# Altium footprint library connectors.PCBLIB: 188 footprints (part 8 of 12)
Each footprint in its own frame and in the unit in brackets; x right, y up, seen from the top. Pads: shape width x height; smd on the part's side, far side on the other; paste and mask are expansions set on the pad; w line width, h text height; cw(c..) or ccw(c..) is an arc to the next point about the centre after c.
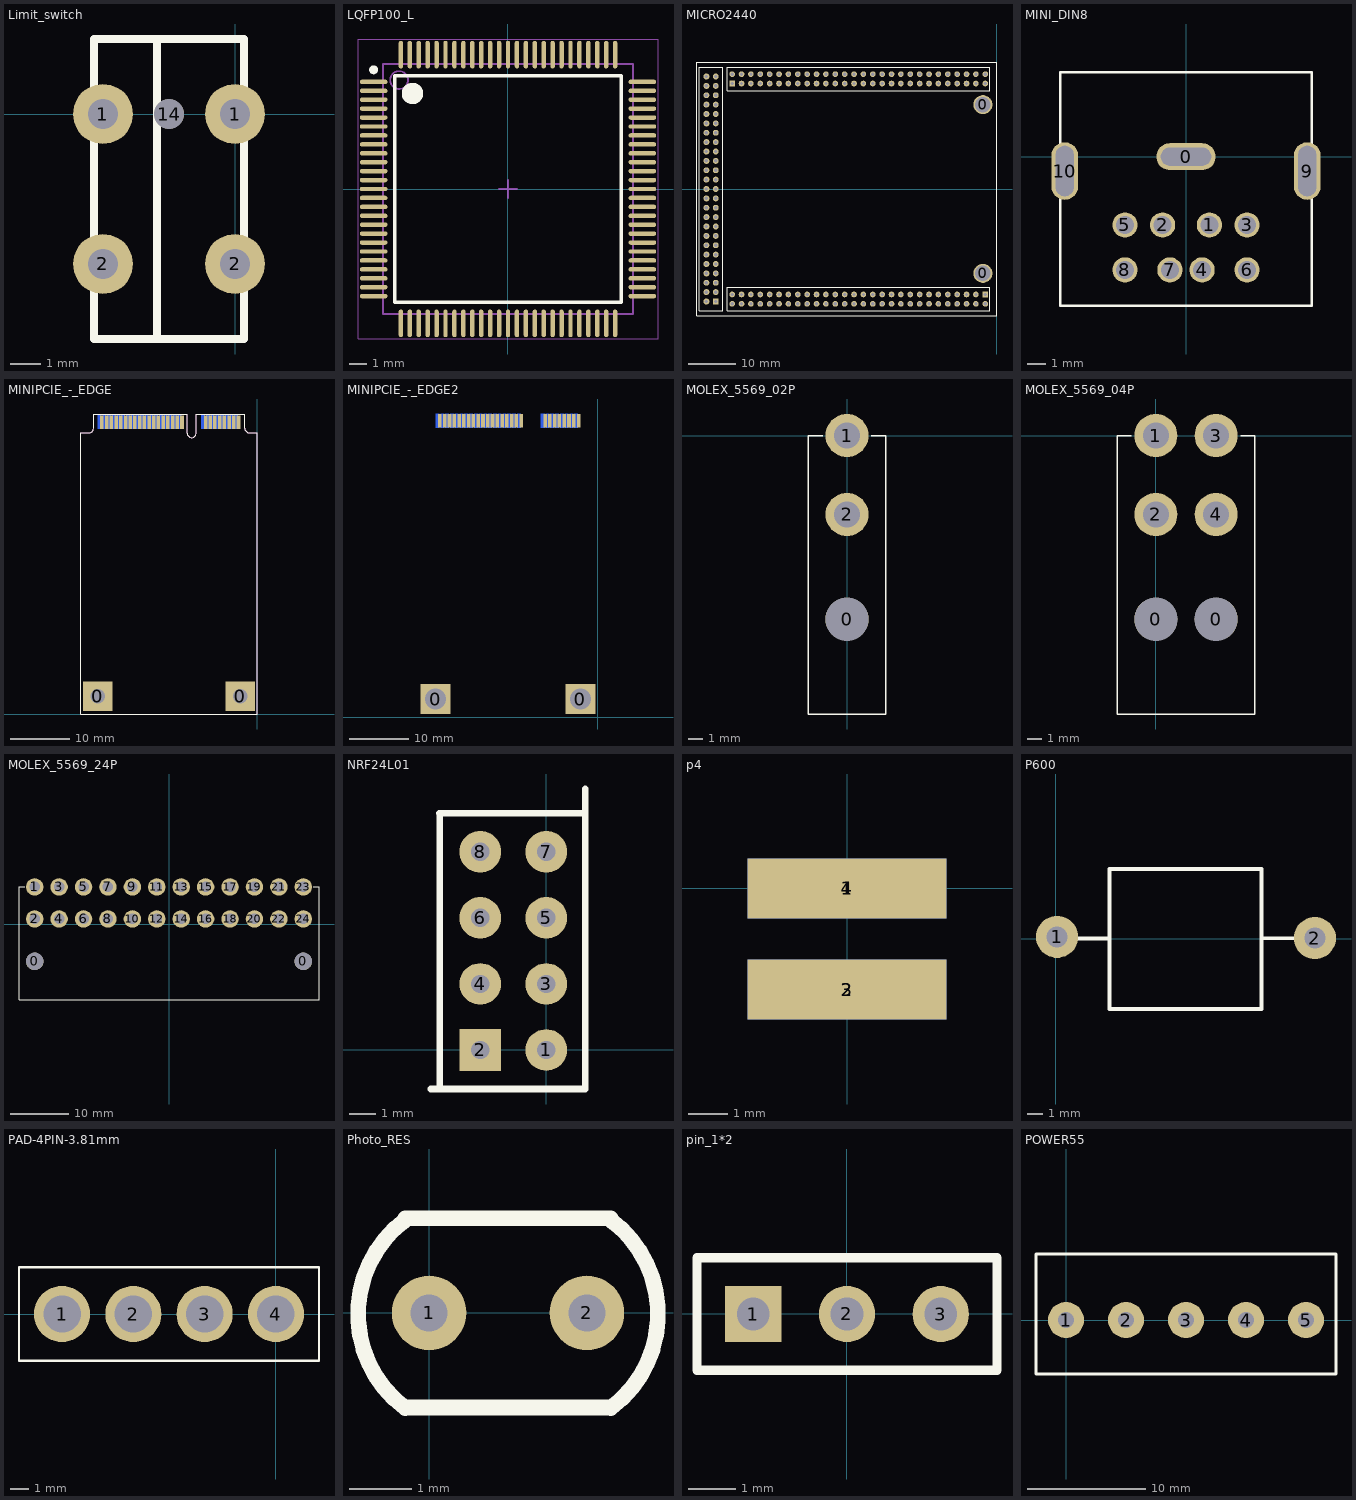
[diagram p7: the footprints below, top view; thin cyan lines are the x and y axes]

## Limit_switch [mm]
pads (5):
  round 2 hole 1: 1(-4.4,0) 1(0,0) 2(-4.4,-5) 2(0,-5)
  round 1 hole 1: 14(-2.2,0)
Top Overlay:
  lines w0.254: -2.6,-7.5 -2.6,2.5 ; -4.7,-7.5 -4.7,2.5 0.3,2.5 0.3,-7.5 -4.7,-7.5

## LQFP100_L [mm] "Thin QFP, 100-Leads, Body 14x14mm, Pitch 0.5mm, IPC High Density"
height 1.6
pads (100):
  oval 1.55x0.25 smd: 1(-7.525,6) 2(-7.525,5.5) 3(-7.525,5) 4(-7.525,4.5) 5(-7.525,4) 6(-7.525,3.5) 7(-7.525,3) 8(-7.525,2.5) 9(-7.525,2) 10(-7.525,1.5) 11(-7.525,1) 12(-7.525,0.5) 13(-7.525,0) 14(-7.525,-0.5) 15(-7.525,-1) 16(-7.525,-1.5) 17(-7.525,-2) 18(-7.525,-2.5) 19(-7.525,-3) 20(-7.525,-3.5) 21(-7.525,-4) 22(-7.525,-4.5) 23(-7.525,-5) 24(-7.525,-5.5) 25(-7.525,-6) 51(7.525,-6) 52(7.525,-5.5) 53(7.525,-5) 54(7.525,-4.5) 55(7.525,-4) 56(7.525,-3.5) 57(7.525,-3) 58(7.525,-2.5) 59(7.525,-2) 60(7.525,-1.5) 61(7.525,-1) 62(7.525,-0.5) 63(7.525,0) 64(7.525,0.5) 65(7.525,1) 66(7.525,1.5) 67(7.525,2) 68(7.525,2.5) 69(7.525,3) 70(7.525,3.5) 71(7.525,4) 72(7.525,4.5) 73(7.525,5) 74(7.525,5.5) 75(7.525,6)
  oval 0.25x1.55 smd: 26(-6,-7.525) 27(-5.5,-7.525) 28(-5,-7.525) 29(-4.5,-7.525) 30(-4,-7.525) 31(-3.5,-7.525) 32(-3,-7.525) 33(-2.5,-7.525) 34(-2,-7.525) 35(-1.5,-7.525) 36(-1,-7.525) 37(-0.5,-7.525) 38(0,-7.525) 39(0.5,-7.525) 40(1,-7.525) 41(1.5,-7.525) 42(2,-7.525) 43(2.5,-7.525) 44(3,-7.525) 45(3.5,-7.525) 46(4,-7.525) 47(4.5,-7.525) 48(5,-7.525) 49(5.5,-7.525) 50(6,-7.525) 76(6,7.525) 77(5.5,7.525) 78(5,7.525) 79(4.5,7.525) 80(4,7.525) 81(3.5,7.525) 82(3,7.525) 83(2.5,7.525) 84(2,7.525) 85(1.5,7.525) 86(1,7.525) 87(0.5,7.525) 88(0,7.525) 89(-0.5,7.525) 90(-1,7.525) 91(-1.5,7.525) 92(-2,7.525) 93(-2.5,7.525) 94(-3,7.525) 95(-3.5,7.525) 96(-4,7.525) 97(-4.5,7.525) 98(-5,7.525) 99(-5.5,7.525) 100(-6,7.525)
Top Overlay:
  circle w0.25: c-7.525,6.675 r0.125
  circle w0.6: c-5.35,5.35 r0.3
  lines w0.2: -6.35,-6.35 -6.35,6.35 6.35,6.35 6.35,-6.35 -6.35,-6.35
Mechanical 13:
  circle w0.1: c-6.1,6.1 r0.5
  lines w0.1: -7,-7 -7,7 7,7 7,-7 -7,-7
Mechanical 15:
  lines w0.05: -8.4,-8.4 -8.4,8.4 8.4,8.4 8.4,-8.4 -8.4,-8.4
  lines w0.1: -0.5,0 0.5,0 ; 0,-0.5 0,0.5
3D body: height 1.6, standoff 0, extent -7,-7 7,7

## MICRO2440 [mm]
pads (164):
  round 4.064 hole 3.302: 0(-3,-18) 0(-3,18)
  rect 1.2x1.2 hole 0.7: PA1(-2.5,-22.5) PC1(-56.5,22.5)
  round 1.2 hole 0.7: PA2(-2.5,-24.5) PA3(-4.5,-22.5) PA4(-4.5,-24.5) PA5(-6.5,-22.5) PA6(-6.5,-24.5) PA7(-8.5,-22.5) PA8(-8.5,-24.5) PA9(-10.5,-22.5) PA10(-10.5,-24.5) PA11(-12.5,-22.5) PA12(-12.5,-24.5) PA13(-14.5,-22.5) PA14(-14.5,-24.5) PA15(-16.5,-22.5) PA16(-16.5,-24.5) PA17(-18.5,-22.5) PA18(-18.5,-24.5) PA19(-20.5,-22.5) PA20(-20.5,-24.5) PA21(-22.5,-22.5) PA22(-22.5,-24.5) PA23(-24.5,-22.5) PA24(-24.5,-24.5) PA25(-26.5,-22.5) PA26(-26.5,-24.5) PA27(-28.5,-22.5) PA28(-28.5,-24.5) PA29(-30.5,-22.5) PA30(-30.5,-24.5) PA31(-32.5,-22.5) PA32(-32.5,-24.5) PA33(-34.5,-22.5) PA34(-34.5,-24.5) PA35(-36.5,-22.5) PA36(-36.5,-24.5) PA37(-38.5,-22.5) PA38(-38.5,-24.5) PA39(-40.5,-22.5) PA40(-40.5,-24.5) PA41(-42.5,-22.5) PA42(-42.5,-24.5) PA43(-44.5,-22.5) PA44(-44.5,-24.5) PA45(-46.5,-22.5) PA46(-46.5,-24.5) PA47(-48.5,-22.5) PA48(-48.5,-24.5) PA49(-50.5,-22.5) PA50(-50.5,-24.5) PA51(-52.5,-22.5) PA52(-52.5,-24.5) PA53(-54.5,-22.5) PA54(-54.5,-24.5) PA55(-56.5,-22.5) PA56(-56.5,-24.5) PC2(-56.5,24.5) PC3(-54.5,22.5) PC4(-54.5,24.5) PC5(-52.5,22.5) PC6(-52.5,24.5) PC7(-50.5,22.5) PC8(-50.5,24.5) PC9(-48.5,22.5) PC10(-48.5,24.5) PC11(-46.5,22.5) PC12(-46.5,24.5) PC13(-44.5,22.5) PC14(-44.5,24.5) PC15(-42.5,22.5) PC16(-42.5,24.5) PC17(-40.5,22.5) PC18(-40.5,24.5) PC19(-38.5,22.5) PC20(-38.5,24.5) PC21(-36.5,22.5) PC22(-36.5,24.5) PC23(-34.5,22.5) PC24(-34.5,24.5) PC25(-32.5,22.5) PC26(-32.5,24.5) PC27(-30.5,22.5) PC28(-30.5,24.5) PC29(-28.5,22.5) PC30(-28.5,24.5) PC31(-26.5,22.5) PC32(-26.5,24.5) PC33(-24.5,22.5) PC34(-24.5,24.5) PC35(-22.5,22.5) PC36(-22.5,24.5) PC37(-20.5,22.5) PC38(-20.5,24.5) PC39(-18.5,22.5) PC40(-18.5,24.5) PC41(-16.5,22.5) PC42(-16.5,24.5) PC43(-14.5,22.5) PC44(-14.5,24.5) PC45(-12.5,22.5) PC46(-12.5,24.5) PC47(-10.5,22.5) PC48(-10.5,24.5) PC49(-8.5,22.5) PC50(-8.5,24.5) PC51(-6.5,22.5) PC52(-6.5,24.5) PC53(-4.5,22.5) PC54(-4.5,24.5) PC55(-2.5,22.5) PC56(-2.5,24.5)
  rect 1.27x1.27 hole 0.7: PB1(-60,-24)
  round 1.27 hole 0.7: PB2(-62,-24) PB3(-60,-22) PB4(-62,-22) PB5(-60,-20) PB6(-62,-20) PB7(-60,-18) PB8(-62,-18) PB9(-60,-16) PB10(-62,-16) PB11(-60,-14) PB12(-62,-14) PB13(-60,-12) PB14(-62,-12) PB15(-60,-10) PB16(-62,-10) PB17(-60,-8) PB18(-62,-8) PB19(-60,-6) PB20(-62,-6) PB21(-60,-4) PB22(-62,-4) PB23(-60,-2) PB24(-62,-2) PB25(-60,0) PB26(-62,0) PB27(-60,2) PB28(-62,2) PB29(-60,4) PB30(-62,4) PB31(-60,6) PB32(-62,6) PB33(-60,8) PB34(-62,8) PB35(-60,10) PB36(-62,10) PB37(-60,12) PB38(-62,12) PB39(-60,14) PB40(-62,14) PB41(-60,16) PB42(-62,16) PB43(-60,18) PB44(-62,18) PB45(-60,20) PB46(-62,20) PB47(-60,22) PB48(-62,22) PB49(-60,24) PB50(-62,24)
Top Overlay:
  lines w0.2: -63.49,-26.005 -63.49,25.995 -58.49,25.995 -58.49,-26.005 -63.49,-26.005
  lines w0.203: -64,-27 0,-27 0,27 -64,27 -64,-27
  lines w0.254: -57.51,-25.999 -57.51,-20.999 -1.51,-20.999 -1.51,-25.999 -57.51,-25.999 ; -57.5,21 -57.5,26 -1.5,26 -1.5,21 -57.5,21

## MINI_DIN8 [mm]
pads (11):
  oval 3.3x1.5 hole 1 slot 2.8 at 0 deg: 0(-0.019,0.013)
  round 1.4 hole 1: 1(1.281,-3.787) 2(-1.319,-3.787) 3(3.381,-3.787) 4(0.881,-6.287) 5(-3.419,-3.787) 6(3.381,-6.287) 7(-0.919,-6.287) 8(-3.419,-6.287)
  oval 1.5x3.2 hole 1 slot 2.8 at 90 deg: 9(6.731,-0.787) 10(-6.769,-0.787)
Top Overlay:
  lines w0.127: -7.019,-2.287 -7.019,-8.287 6.981,-8.287 6.981,-2.287 ; -7.019,0.664 -7.019,4.713 6.981,4.713 6.981,0.664

## MINIPCIE_-_EDGE [mm]
pads (54):
  rect 5x5 hole 2.5: 0(-27.127,3.023) 0(-2.896,3.023)
  rect 0.6x2.3 smd: 1(-3.2,49.581) 3(-4,49.581) 5(-4.8,49.581) 7(-5.6,49.581) 9(-6.4,49.581) 11(-7.2,49.581) 13(-8,49.581) 15(-8.8,49.581) 17(-12.8,49.581) 19(-13.6,49.581) 21(-14.4,49.581) 23(-15.2,49.581) 25(-16,49.581) 27(-16.8,49.581) 29(-17.6,49.581) 31(-18.4,49.581) 33(-19.2,49.581) 35(-20,49.581) 37(-20.8,49.581) 39(-21.6,49.581) 41(-22.4,49.581) 43(-23.2,49.581) 45(-24,49.581) 47(-24.8,49.581) 49(-25.6,49.581) 51(-26.4,49.581)
  rect 0.6x2.3 smd far side: 2(-3.6,49.581) 4(-4.4,49.581) 6(-5.2,49.581) 8(-6,49.581) 10(-6.8,49.581) 12(-7.6,49.581) 14(-8.4,49.581) 16(-9.2,49.581) 18(-13.2,49.581) 20(-14,49.581) 22(-14.8,49.581) 24(-15.6,49.581) 26(-16.4,49.581) 28(-17.2,49.581) 30(-18,49.581) 32(-18.8,49.581) 34(-19.6,49.581) 36(-20.4,49.581) 38(-21.2,49.581) 40(-22,49.581) 42(-22.8,49.581) 44(-23.6,49.581) 46(-24.4,49.581) 48(-25.2,49.581) 50(-26,49.581) 52(-26.8,49.581)
Top Overlay:
  lines w0.127: -30.023,0 -30.023,47.777 -28.6,47.777 ccw(c-28.6,48.539) -27.838,48.539 -27.838,50.978 -11.913,50.978 -11.913,47.752 -11.913,47.727 ccw(c-11.151,47.727) -11.151,46.965 ccw(c-11.151,47.727) -10.389,47.727 -10.389,50.978 -2.159,50.978 -2.159,48.59 ccw(c-1.346,48.59) -1.346,47.777 0,47.777 0,0 -30.023,0
Keep-Out Layer:
  lines w0.127: -30.023,0 -30.023,47.777 -28.651,47.777 -28.6,47.777 ccw(c-28.6,48.539) -27.838,48.539 -27.838,50.978 -11.913,50.978 -11.913,47.727 ccw(c-11.151,47.727) -11.151,46.965 ccw(c-11.151,47.727) -10.389,47.727 -10.389,50.978 -2.159,50.978 -2.159,48.59 ccw(c-1.346,48.59) -1.346,47.777 0,47.777 0,0 -30.023,0

## MINIPCIE_-_EDGE2 [mm]
pads (54):
  rect 5x5 hole 3.5: 0(-27.127,3.023) 0(-2.896,3.023)
  rect 0.6x2.3 smd: 1(-3.2,49.581) 3(-4,49.581) 5(-4.8,49.581) 7(-5.6,49.581) 9(-6.4,49.581) 11(-7.2,49.581) 13(-8,49.581) 15(-8.8,49.581) 17(-12.8,49.581) 19(-13.6,49.581) 21(-14.4,49.581) 23(-15.2,49.581) 25(-16,49.581) 27(-16.8,49.581) 29(-17.6,49.581) 31(-18.4,49.581) 33(-19.2,49.581) 35(-20,49.581) 37(-20.8,49.581) 39(-21.6,49.581) 41(-22.4,49.581) 43(-23.2,49.581) 45(-24,49.581) 47(-24.8,49.581) 49(-25.6,49.581) 51(-26.4,49.581)
  rect 0.6x2.3 smd far side: 2(-3.6,49.581) 4(-4.4,49.581) 6(-5.2,49.581) 8(-6,49.581) 10(-6.8,49.581) 12(-7.6,49.581) 14(-8.4,49.581) 16(-9.2,49.581) 18(-13.2,49.581) 20(-14,49.581) 22(-14.8,49.581) 24(-15.6,49.581) 26(-16.4,49.581) 28(-17.2,49.581) 30(-18,49.581) 32(-18.8,49.581) 34(-19.6,49.581) 36(-20.4,49.581) 38(-21.2,49.581) 40(-22,49.581) 42(-22.8,49.581) 44(-23.6,49.581) 46(-24.4,49.581) 48(-25.2,49.581) 50(-26,49.581) 52(-26.8,49.581)

## MOLEX_5569_02P [mm]
pads (3):
  round 3 hole 3: 0(0,-12.8)
  round 3 hole 1.8: 1(0,0) 2(0,-5.5)
Top Overlay:
  lines w0.1: -1.7,0 -2.7,0 -2.7,-19.4 2.7,-19.4 2.7,0 1.7,0

## MOLEX_5569_04P [mm]
pads (6):
  round 3 hole 3: 0(0,-12.8) 0(4.2,-12.8)
  round 3 hole 1.8: 1(0,0) 2(0,-5.5) 3(4.2,0) 4(4.2,-5.5)
Top Overlay:
  lines w0.1: -1.7,0 -2.7,0 -2.7,-19.4 6.9,-19.4 6.9,0 5.9,0

## MOLEX_5569_24P [mm]
pads (26):
  round 3 hole 3: 0(-23.1,-6.4) 0(23.1,-6.4)
  round 3 hole 1.8: 1(-23.1,6.4) 2(-23.1,0.9) 3(-18.9,6.4) 4(-18.9,0.9) 5(-14.7,6.4) 6(-14.7,0.9) 7(-10.5,6.4) 8(-10.5,0.9) 9(-6.3,6.4) 10(-6.3,0.9) 11(-2.1,6.4) 12(-2.1,0.9) 13(2.1,6.4) 14(2.1,0.9) 15(6.3,6.4) 16(6.3,0.9) 17(10.5,6.4) 18(10.5,0.9) 19(14.7,6.4) 20(14.7,0.9) 21(18.9,6.4) 22(18.9,0.9) 23(23.1,6.4) 24(23.1,0.9)
Top Overlay:
  lines w0.1: -24.8,6.4 -25.8,6.4 -25.8,-13 25.8,-13 25.8,6.4 24.8,6.4

## NRF24L01 [mm]
pads (8):
  round 1.6 hole 0.7: 1(0,0) 3(0,2.54) 4(-2.54,2.54) 5(0,5.08) 6(-2.54,5.08) 7(0,7.62) 8(-2.54,7.62)
  rect 1.6x1.6 hole 0.7: 2(-2.54,0)
Top Overlay:
  lines w0.254: -4.445,-1.5 1.5,-1.5 1.5,10.033 ; -4.089,-1.5 -4.089,9.068 -4.115,9.093 1.5,9.093

## p4 [mm]
pads (4):
  rect 5x1.5 smd: 1(0,0) 2(0,-2.54)
  rect 5x1.5 smd far side: 3(0,-2.54) 4(0,0)

## P600 [mm]
pads (2):
  round 2.8 hole 1.4: 1(0.076,0.127) 2(17.221,0.051)
Top Overlay:
  lines w0.254: 1.524,0.025 3.505,0.025 ; 13.665,-4.674 3.556,-4.674 3.556,4.648 13.665,4.648 13.665,-4.572 ; 13.665,0.038 15.977,0.038

## PAD-4PIN-3.81mm [mm]
pads (4):
  round 3 hole 2: 1(-11.43,0) 2(-7.62,0) 3(-3.81,0) 4(0,0)
Top Overlay:
  lines w0.127: -13.73,-2.5 2.3,-2.5 2.3,1.85 2.3,2.5 -13.73,2.5 -13.73,0 -13.73,-2.5

## Photo_RES [mm]
pads (2):
  round 1.2 hole 0.6: 1(0,0) 2(2.54,0)
Top Overlay:
  lines w0.254: -0.386,-1.53 cw(c0.743,-0.017) -0.37,1.508 ; -0.381,-1.524 2.921,-1.524 ; -0.381,1.524 2.921,1.524 ; 2.91,1.508 cw(c1.797,-0.017) 2.926,-1.53

## pin_1*2 [mm]
pads (3):
  rect 1.2x1.2 hole 0.7: 1(-2,0)
  round 1.2 hole 0.7: 2(0,0) 3(2,0)
Top Overlay:
  lines w0.2: -3.2,-1.2 -3.2,1.2 3.2,1.2 3.2,-1.2 -3.2,-1.2

## POWER55 [mil]
pads (5):
  round 120 hole 52: 1(0,0) 2(200,0) 3(400,0) 4(600,0) 5(800,0)
Top Overlay:
  lines w10: -100,-180 -100,100 -100,220 900,220 900,-180 -100,-180